# Altium footprint library DrPCB.PcbLib: 910 footprints (part 32 of 57)
Each footprint in its own frame and in the unit in brackets; x right, y up, seen from the top. Pads: shape width x height; smd on the part's side, far side on the other; paste and mask are expansions set on the pad; w line width, h text height; cw(c..) or ccw(c..) is an arc to the next point about the centre after c.
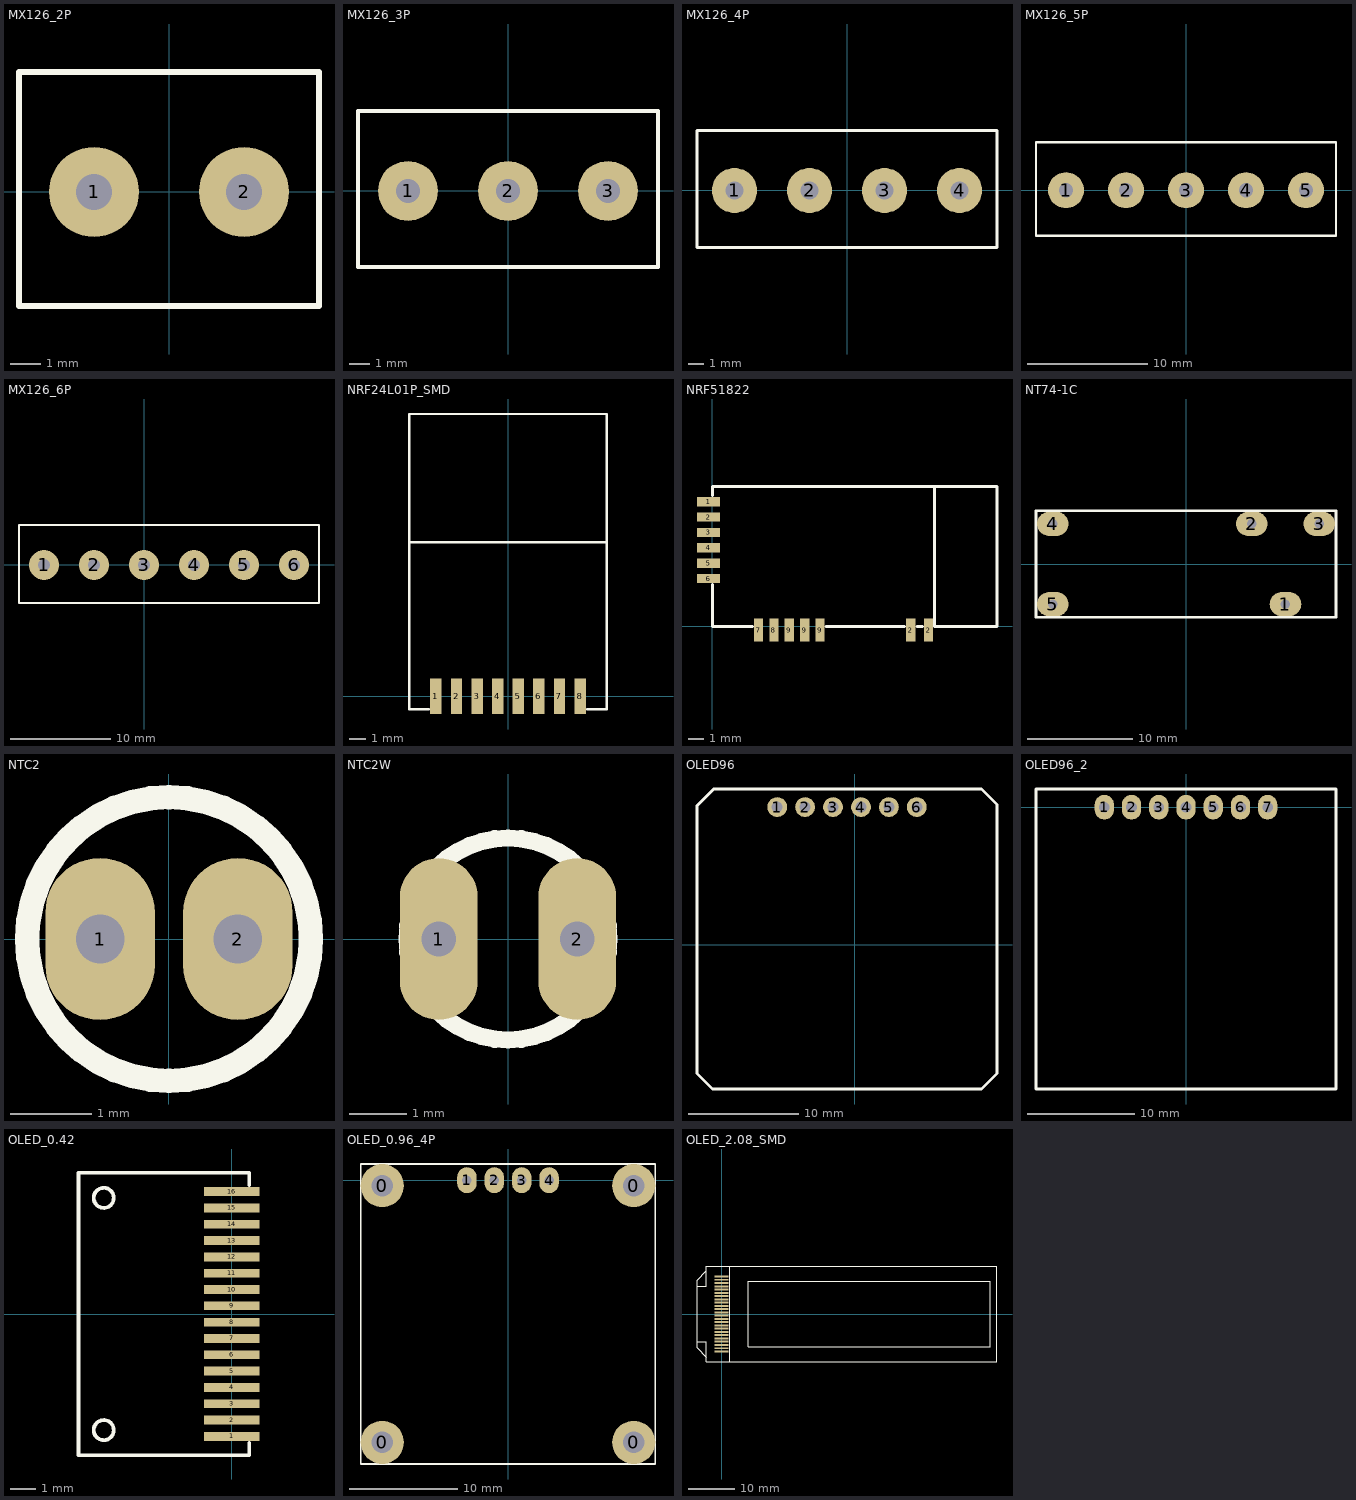
[diagram p31: the footprints below, top view; thin cyan lines are the x and y axes]

## MX126_2P [mm]
pads (2):
  round 3 hole 1.2: 1(-2.5,0) 2(2.5,0)
Top Overlay:
  lines w0.2: -5,-3.8 -5,4 5,4 5,-3.8 -5,-3.8
3D body "User Library-DG126-5_0-02P.STEP": height 10.21, standoff -2.19, extent -5.125,-3.8 5.125,4

## MX126_3P [mm]
pads (3):
  round 3 hole 1.2: 1(-5,0) 2(0,0) 3(5,0)
Top Overlay:
  lines w0.2: -7.5,-3.8 -7.5,4 7.5,4 7.5,-3.8 -7.5,-3.8
3D body "User Library-DG126-5_0-03P.STEP": height 10.21, standoff -2.19, extent -7.625,-3.9 7.625,3.9

## MX126_4P [mm]
pads (4):
  round 3 hole 1.2: 1(-7.5,0) 2(-2.5,0) 3(2.5,0) 4(7.5,0)
Top Overlay:
  lines w0.2: -10,-3.8 -10,4 10,4 10,-3.8 -10,-3.8
3D body "User Library-DG126-5_0-02P.STEP": height 10.21, standoff -2.19, extent -0.125,-3.8 10.125,4
3D body "User Library-DG126-5_0-02P.STEP": height 10.21, standoff -2.19, extent -10.125,-3.8 0.125,4

## MX126_5P [mm]
pads (5):
  round 3 hole 1.2: 1(-10,0) 2(-5,0) 3(0,0) 4(5,0) 5(10,0)
Top Overlay:
  lines w0.2: -12.5,-3.8 12.5,-3.8 12.5,4 -12.5,4 -12.5,-3.8
3D body "User Library-DG126-5_0-03P.STEP": height 10.21, standoff -2.19, extent -2.625,-3.8 12.625,4
3D body "User Library-DG126-5_0-02P.STEP": height 10.21, standoff -2.19, extent -12.625,-3.8 -2.375,4

## MX126_6P [mm]
pads (6):
  round 3 hole 1.2: 1(-10,0) 2(-5,0) 3(0,0) 4(5,0) 5(10,0) 6(15,0)
Top Overlay:
  lines w0.2: -12.5,-3.8 17.5,-3.8 17.5,4 -12.5,4 -12.5,-3.8
3D body "User Library-DG126-5_0-03P.STEP": height 10.21, standoff -2.19, extent -12.625,-3.8 2.625,4
3D body "User Library-DG126-5_0-03P.STEP": height 10.21, standoff -2.19, extent 2.375,-3.8 17.625,4

## NRF24L01P_SMD [mm]
pads (8):
  rect 0.7x2.2 smd: 1(-4.445,0) 2(-3.175,0) 3(-1.905,0) 4(-0.635,0) 5(0.635,0) 6(1.905,0) 7(3.175,0) 8(4.445,0)
Top Overlay:
  lines w0.15: -6.1,9.499 6.1,9.499 ; -4.877,-0.8 -6.1,-0.8 -6.1,17.4 6.1,17.4 6.1,-0.8 4.877,-0.8
3D body "User Library-4-11.step": height 0.81, standoff 0.01, extent -6,-0.7 6,17.3

## NRF51822 [mm]
pads (13):
  rect 1.5x0.6 smd: 1(-0.25,8.1) 2(-0.25,7.1) 3(-0.25,6.1) 4(-0.25,5.1) 5(-0.25,4.1) 6(-0.25,3.1)
  rect 0.6x1.5 smd: 2(12.9,-0.25) 2(14.05,-0.25) 7(3,-0.25) 8(4,-0.25) 9(5,-0.25) 9(6,-0.25) 9(7,-0.25)
Top Overlay:
  lines w0.2: 0,2.7 0,0 2.6,0 ; 0,8.5 0,9.1 18.5,9.1 18.5,0 14.45,0 ; 7.4,0 12.5,0 ; 13.3,0 13.65,0 ; 14.449,0 14.449,9.1

## NT74-1C [mm]
pads (5):
  oval 3x2.3 hole 0.9: 1(9.45,-3.81) 2(6.25,3.81) 3(12.65,3.81) 4(-12.65,3.81) 5(-12.65,-3.81)
Top Overlay:
  lines w0.254: -14.25,5.029 -14.25,-5.05 14.25,-5.05 14.25,5.029 ; -14.25,5.05 14.25,5.05
3D body: height 12.5, standoff 0, extent -14.262,-5.067 14.262,5.067

## NTC2 [mm]
pads (2):
  oval 1.35x2 hole 0.6: 1(-0.85,0) 2(0.85,0)
Top Overlay:
  circle w0.3: c0,0 r1.75
3D body "User Library-Thermistor-2.step": height 5, standoff -3, extent -1.89,-1.886 1.89,1.886

## NTC2W [mm]
pads (2):
  oval 1.35x2.8 hole 0.6: 1(-1.2,0) 2(1.2,0)
Top Overlay:
  circle w0.3: c0,0 r1.75
3D body "User Library-Thermistor-2.step": height 5, standoff -3, extent -1.89,-1.886 1.89,1.886

## OLED96 [mm]
pads (6):
  round 1.8 hole 1: 1(-7.061,12.509) 2(-4.521,12.509) 3(-1.981,12.509) 4(0.559,12.509) 5(3.099,12.509) 6(5.639,12.509)
Top Overlay:
  lines w0.254: -14.361,-11.737 -12.958,-13.14 11.536,-13.14 12.939,-11.737 12.939,12.741 11.52,14.159 -12.841,14.159 -14.361,12.639 -14.361,-11.737

## OLED96_2 [mm]
pads (7):
  oval 1.8x2.3 hole 1: 1(-7.62,0) 2(-5.08,0) 3(-2.54,0) 4(0,0) 5(2.54,0) 6(5.08,0) 7(7.62,0)
Top Overlay:
  lines w0.254: -14,-26.3 -14,1.7 14,1.7 14,-26.3 -14,-26.3

## OLED_0.42 [mm]
pads (16):
  rect 2.2x0.35 smd: 1(0,-4.875) 2(0,-4.225) 3(0,-3.575) 4(0,-2.925) 5(0,-2.275) 6(0,-1.625) 7(0,-0.975) 8(0,-0.325) 9(0,0.325) 10(0,0.975) 11(0,1.625) 12(0,2.275) 13(0,2.925) 14(0,3.575) 15(0,4.225) 16(0,4.875)
Top Overlay:
  circle w0.15: c-5.1,-4.625 r0.4
  circle w0.15: c-5.1,4.625 r0.4
  lines w0.15: -6.1,5.597 -6.1,-5.625 0.7,-5.625 0.7,-5.142 ; -6.1,5.625 0.7,5.625 0.7,5.142

## OLED_0.49 [mm]
3D body "0.49 inch OLED 64x32 - Without glass - Reverse Mount.stp": height 1.58, standoff -0.61, extent -6.75,-8.378 6.75,3

## OLED_0.96_4P [mm]
pads (8):
  round 4 hole 2: 0(-11.65,-24.3) 0(-11.65,-0.5) 0(11.65,-24.3) 0(11.65,-0.5)
  oval 1.8x2.4 hole 0.9: 1(-3.81,0) 2(-1.27,0) 3(1.27,0) 4(3.81,0)
Top Overlay:
  lines w0.15: -13.65,-26.3 -13.65,1.5 13.65,1.5 13.65,-26.3 -13.65,-26.3
3D body "OLED TFT 0.96 inch 64x128 monochrome.STEP": height 5.61, standoff -6.69, extent -13.65,-26.3 13.65,1.5

## OLED_2.08_SMD [mm]
pads (24):
  rect 3x0.4 smd: 1(0,-8.05) 2(0,-7.35) 3(0,-6.65) 4(0,-5.95) 5(0,-5.25) 6(0,-4.55) 7(0,-3.85) 8(0,-3.15) 9(0,-2.45) 10(0,-1.75) 11(0,-1.05) 12(0,-0.35) 13(0,0.35) 14(0,1.05) 15(0,1.75) 16(0,2.45) 17(0,3.15) 18(0,3.85) 19(0,4.55) 20(0,5.25) 21(0,5.95) 22(0,6.65) 23(0,7.35) 24(0,8.05)
Top Overlay:
  lines w0.2: -3.295,-9.3 -5.3,-7.295 -5.3,-6 ; -3.295,9.283 -3.312,9.283 -5.3,7.295 -5.3,6 ; 1.705,-10.3 1.705,10.3 ; -5.3,-6 -3.315,-6 -3.315,-10.3 59.205,-10.3 59.205,10.3 -3.295,10.3 -3.295,6 -5.3,6 ; -5.3,-6 -5.3,6 ; -5.3,6 -5.3,6 ; 5.705,-7 5.705,7 57.705,7 57.705,-7 5.705,-7
3D body: height 1, standoff 0, extent -3.302,-10.3 59.207,10.312
3D body: height 1.1, standoff 0, extent 5.651,-7.074 57.734,7.01
3D body: height 1.7, standoff 1, extent -3.302,-10.3 59.207,10.312